# Altium footprint library CADTcommon.PcbLib: 503 footprints (part 26 of 32)
Each footprint in its own frame and in the unit in brackets; x right, y up, seen from the top. Pads: shape width x height; smd on the part's side, far side on the other; paste and mask are expansions set on the pad; w line width, h text height; cw(c..) or ccw(c..) is an arc to the next point about the centre after c.
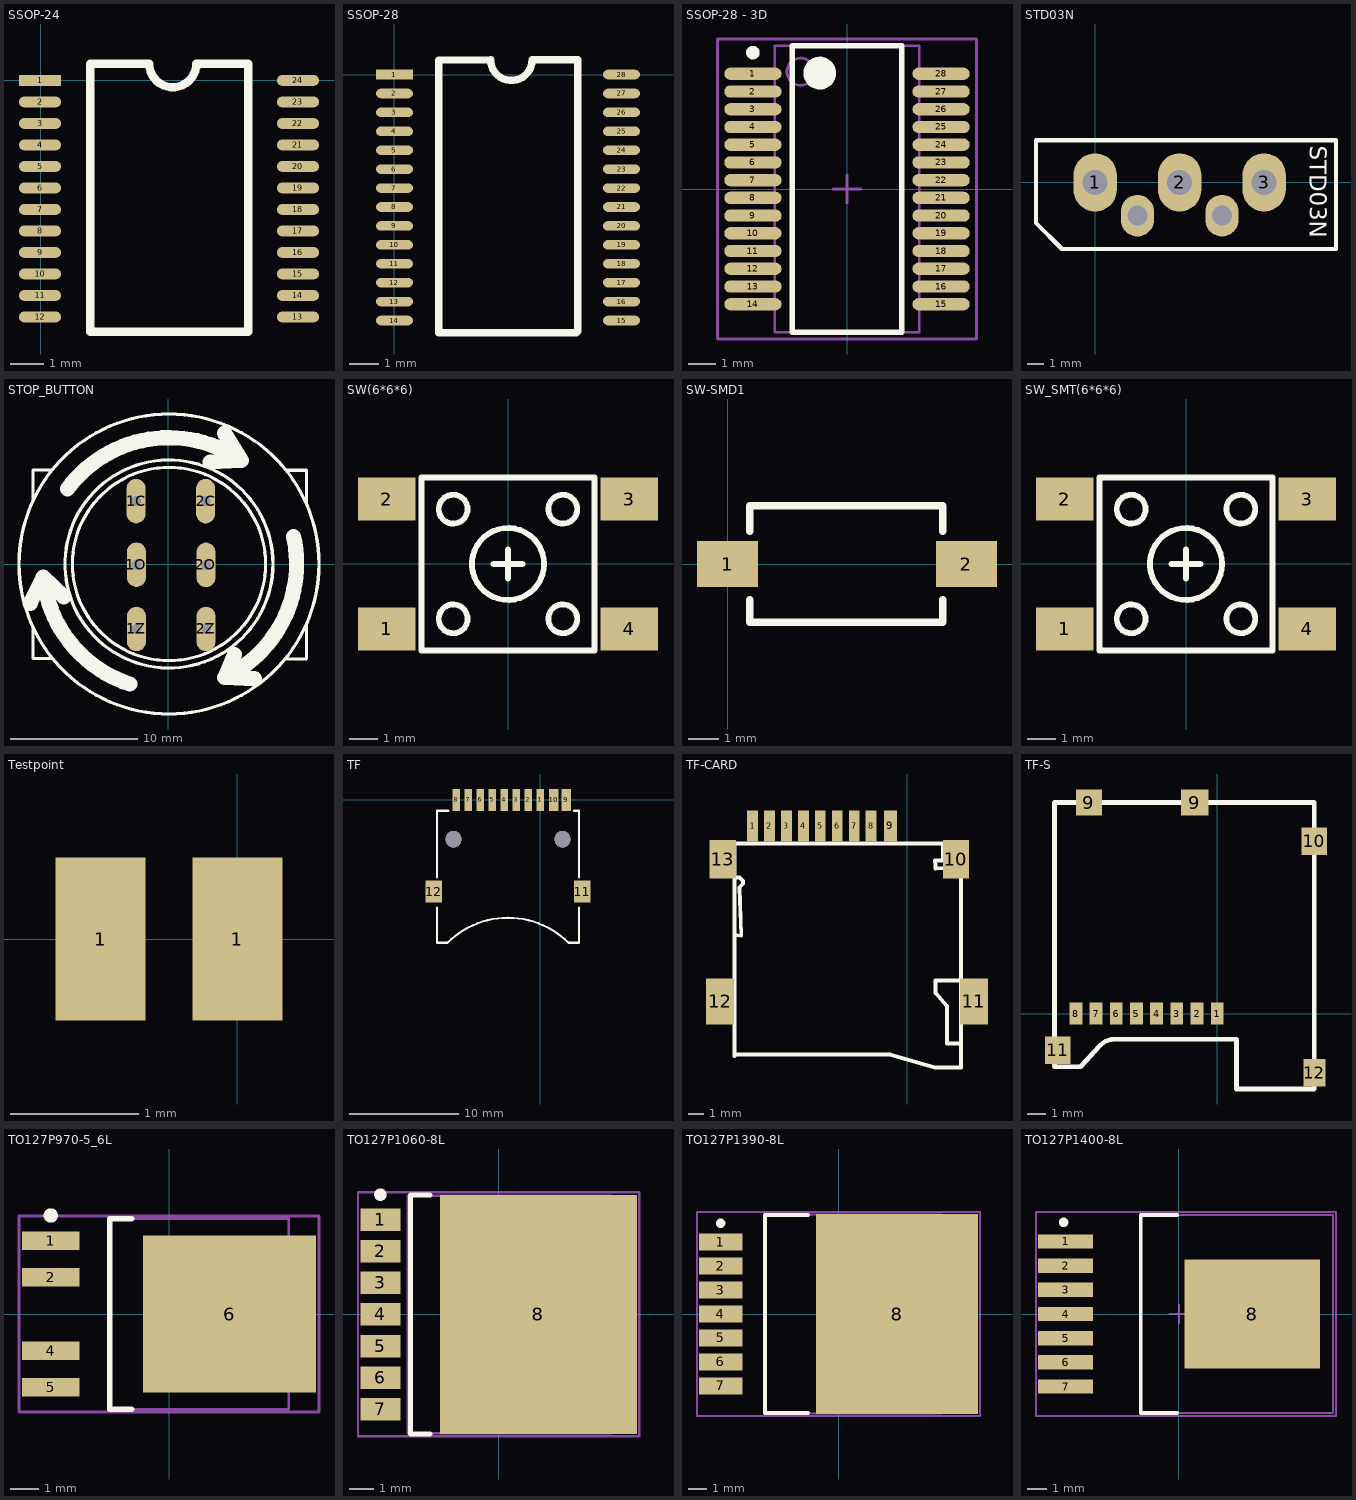
[diagram p25: the footprints below, top view; thin cyan lines are the x and y axes]

## SSOP-24 [mm]
pads (24):
  rect 1.27x0.33 smd: 1(-0.025,0)
  oval 1.27x0.33 smd: 2(-0.025,-0.65) 3(-0.025,-1.3) 4(-0.025,-1.95) 5(-0.025,-2.6) 6(-0.025,-3.25) 7(-0.025,-3.9) 8(-0.025,-4.55) 9(-0.025,-5.2) 10(-0.025,-5.85) 11(-0.025,-6.5) 12(-0.025,-7.15) 13(7.775,-7.15) 14(7.775,-6.5) 15(7.775,-5.85) 16(7.775,-5.2) 17(7.775,-4.55) 18(7.775,-3.9) 19(7.775,-3.25) 20(7.775,-2.6) 21(7.775,-1.95) 22(7.775,-1.3) 23(7.775,-0.65) 24(7.775,0)
Top Overlay:
  lines w0.254: 6.223,-7.6 1.499,-7.6 1.499,0.5 3.269,0.5 3.277,0.508 ccw(c3.99,0.508) 4.703,0.508 6.266,0.508 6.274,0.5 6.274,-7.6

## SSOP-28 [mm]
pads (28):
  rect 1.27x0.33 smd: 1(0,0)
  oval 1.27x0.33 smd: 2(0,-0.65) 3(0,-1.3) 4(0,-1.95) 5(0,-2.6) 6(0,-3.25) 7(0,-3.9) 8(0,-4.55) 9(0,-5.2) 10(0,-5.85) 11(0,-6.5) 12(0,-7.15) 13(0,-7.8) 14(0,-8.45) 15(7.8,-8.45) 16(7.8,-7.8) 17(7.8,-7.15) 18(7.8,-6.5) 19(7.8,-5.85) 20(7.8,-5.2) 21(7.8,-4.55) 22(7.8,-3.9) 23(7.8,-3.25) 24(7.8,-2.6) 25(7.8,-1.95) 26(7.8,-1.3) 27(7.8,-0.65) 28(7.8,0)
Top Overlay:
  lines w0.254: 1.524,-8.865 6.248,-8.865 6.299,-8.814 6.299,0.5 6.291,0.508 4.728,0.508 cw(c4.015,0.508) 3.302,0.508 3.294,0.5 1.524,0.5 1.524,-8.865

## SSOP-28 - 3D [mm] "SOP, 28-Leads, Body 10.5x5.3mm (max), Pitch 0.65mm, IPC Medium Density"
height 2
pads (28):
  oval 2.1x0.45 smd: 1(-3.45,4.225) 2(-3.45,3.575) 3(-3.45,2.925) 4(-3.45,2.275) 5(-3.45,1.625) 6(-3.45,0.975) 7(-3.45,0.325) 8(-3.45,-0.325) 9(-3.45,-0.975) 10(-3.45,-1.625) 11(-3.45,-2.275) 12(-3.45,-2.925) 13(-3.45,-3.575) 14(-3.45,-4.225) 15(3.45,-4.225) 16(3.45,-3.575) 17(3.45,-2.925) 18(3.45,-2.275) 19(3.45,-1.625) 20(3.45,-0.975) 21(3.45,-0.325) 22(3.45,0.325) 23(3.45,0.975) 24(3.45,1.625) 25(3.45,2.275) 26(3.45,2.925) 27(3.45,3.575) 28(3.45,4.225)
Top Overlay:
  circle w0.25: c-3.45,5 r0.125
  circle w0.6: c-1,4.25 r0.3
  lines w0.2: -2,-5.25 -2,5.25 2,5.25 2,-5.25 -2,-5.25
Mechanical 13:
  circle w0.1: c-1.7,4.3 r0.5
  lines w0.1: -2.65,-5.25 -2.65,5.25 2.65,5.25 2.65,-5.25 -2.65,-5.25
Mechanical 15:
  lines w0.1: -0.5,0 0.5,0 ; 0,-0.5 0,0.5 ; -4.75,-5.5 -4.75,5.5 4.75,5.5 4.75,-5.5 -4.75,-5.5
3D body: height 2, standoff 0.25, extent -2.65,-5.25 2.65,5.25

## STD03N [mm]
pads (5):
  oval 2.6x3.5 hole 1.5: 1(0,0) 2(5.08,0) 3(10.16,0)
  oval 2x2.5 hole 1.2: ""(2.54,-2) ""(7.62,-2)
Top Overlay:
  lines w0.254: -3.556,-2.438 -2.007,-3.988 ; -3.556,2.54 14.351,2.54 ; -3.55,-2.438 -3.55,2.534 14.478,2.534 14.478,-4 -2,-4
  text "STD03N" at 12.903,2.21 h1
Bottom Overlay:
  lines w0.254: -3.556,-2.438 -2.007,-3.988 ; -3.556,2.541 14.351,2.541 ; -3.55,-2.438 -3.55,2.535 ; -2,-4 14.478,-4 ; 14.478,2.535 14.478,2.541
3D body: height 30.15, standoff -9.1, extent -2.82,-2.261 12.93,2.889

## STOP_BUTTON [mm] "CE104"
pads (6):
  oval 1.5x3.5 hole 0.8: 1C(-2.547,4.948) 1O(-2.517,-0.052) 1Z(-2.517,-5.107) 2C(2.923,4.948) 2O(2.953,-0.067) 2Z(2.953,-5.107)
Top Overlay:
  circle w0.254: c0.043,0.003 r11.8
  circle w0.254: c0.043,0.003 r8.183
  circle w0.254: c0.043,0.003 r7.6
  lines w0.254: -10.647,-7.437 -10.647,-4.937 ; -10.647,4.973 -10.647,7.403 -9.157,7.403 ; -10.617,-7.437 -9.147,-7.437 ; 9.193,-7.467 10.853,-7.467 10.853,-4.707 ; 9.263,7.373 10.823,7.373 ; 10.853,4.713 10.853,7.373
  lines w1.2: -10.867,-3.077 -9.84,-1.021 ; -8.227,-2.577 -9.84,-1.021 ; -7.941,5.917 cw(c0.043,0.003) 5.734,8.147 ; -3.052,-9.439 cw(c0.043,0.003) -9.84,-1.021 ; 3.283,8.033 5.734,8.147 ; 4.403,10.293 5.734,8.147 ; 5.203,-7.107 4.438,-8.927 ; 6.753,-9.027 4.438,-8.927 ; 9.846,2.169 cw(c0.143,0.033) 4.438,-8.927
Mechanical 1:
  lines w1: -2.557,6.163 -2.547,3.753 ; -2.527,-3.892 -2.517,-6.302 ; -2.527,1.163 -2.517,-1.247 ; 2.913,3.673 2.913,6.173 ; 2.943,-3.892 2.953,-6.302 ; 2.943,1.148 2.953,-1.262

## SW(6*6*6) [mm]
pads (4):
  rect 2x1.5 smd: 1(-4.204,-2.266) 2(-4.204,2.234) 3(4.196,2.234) 4(4.196,-2.266)
Top Overlay:
  circle w0.2: c-1.904,-1.916 r0.5
  circle w0.2: c-1.904,1.884 r0.5
  circle w0.2: c1.896,-1.916 r0.5
  circle w0.2: c1.896,1.884 r0.5
  circle w0.2: c-0.004,-0.016 r1.25
  lines w0.2: -0.504,-0.016 0.496,-0.016 ; -0.004,-0.516 -0.004,0.484 ; -3.004,-3.016 2.996,-3.016 2.996,2.984 -3.004,2.984 -3.004,-3.016

## SW-SMD1 [mm]
pads (2):
  rect 2x1.5 smd: 1(0,0) 2(7.8,0)
Top Overlay:
  lines w0.254: 0.725,-1.168 0.725,-1.9 7.025,-1.9 7.025,-1.168 ; 0.725,1.067 0.725,1.9 7.025,1.9 7.025,1.067
3D body: height 2.5, standoff 0, extent -0.059,-1.945 7.831,1.905

## SW_SMT(6*6*6) [mm]
pads (4):
  rect 2x1.5 smd: 1(-4.204,-2.266) 2(-4.204,2.234) 3(4.196,2.234) 4(4.196,-2.266)
Top Overlay:
  circle w0.2: c-0.004,-0.016 r1.25
  circle w0.2: c1.896,1.884 r0.5
  circle w0.2: c1.896,-1.916 r0.5
  circle w0.2: c-1.904,1.884 r0.5
  circle w0.2: c-1.904,-1.916 r0.5
  lines w0.2: -0.504,-0.016 0.496,-0.016 ; -0.004,-0.516 -0.004,0.484 ; -3.004,-3.016 -3.004,2.984 2.996,2.984 2.996,-3.016 -3.004,-3.016

## Testpoint [mm]
pads (2):
  rect 0.7x1.27 smd: 1(-1.067,0) 1(0,0)

## TF [mm]
pads (12):
  rect 0.7x2 smd: 1(0,0) 2(-1.1,0) 3(-2.2,0) 4(-3.3,0) 5(-4.4,0) 6(-5.5,0) 7(-6.6,0) 8(-7.7,0)
  rect 0.85x2 smd: 9(2.4,0) 10(1.25,0)
  rect 1.5x2 smd: 11(3.87,-8.4) 12(-9.77,-8.4)
via 2.05,-3.6 diameter 1.5 hole 1.5
via -7.95,-3.6 diameter 1.5 hole 1.5
Top Overlay:
  lines w0.2: -9.465,-9.872 -9.465,-13.1 -8.5,-13.1 cw(c-2.95,-18.65) 2.6,-13.1 3.565,-13.1 3.565,-9.872 ; -9.465,-7.103 -9.465,-1 -8.417,-1 ; 3.108,-1 3.565,-1 3.565,-7.103

## TF-CARD [mm]
pads (13):
  rect 0.7x2 smd: 1(-10.058,-7.188) 2(-8.958,-7.188) 3(-7.858,-7.188) 4(-6.758,-7.188) 5(-5.658,-7.188) 6(-4.558,-7.188) 7(-3.458,-7.188) 8(-2.358,-7.188)
  rect 0.85x2 smd: 9(-1.108,-7.188)
  rect 1.7x2.5 smd: 10(3.15,-9.373) 13(-11.989,-9.373)
  rect 1.8x3 smd: 11(4.318,-18.593) 12(-12.167,-18.593)
Top Overlay:
  lines w0.254: -11.227,-22.149 -11.227,-8.331 2.311,-8.331 2.311,-9.449 1.803,-9.449 1.829,-9.754 1.829,-9.964 3.48,-9.938 3.48,-22.885 1.778,-22.885 -1.143,-22.047 -11.227,-22.047 ; -11.227,-14.275 -10.795,-14.326 -10.897,-11.176 -10.668,-10.947 -10.668,-10.77 -10.897,-10.541 -11.176,-10.541 ; 3.429,-21.336 2.565,-21.336 2.565,-18.898 1.829,-18.034 1.829,-17.221 3.48,-17.221

## TF-S [mm]
pads (13):
  rect 0.7x1.2 smd: 1(0,0) 2(-1.1,0) 3(-2.2,0) 4(-3.3,0) 5(-4.4,0) 6(-5.5,0) 7(-6.6,0) 8(-7.7,0)
  rect 1.4x1.4 smd: 9(-6.99,11.5)
  rect 1.48x1.4 smd: 9(-1.22,11.5)
  rect 1.4x1.5 smd: 10(5.3,9.379) 11(-8.7,-2)
  rect 1.2x1.5 smd: 12(5.3,-3.23)
Top Overlay:
  lines w0.254: -8.868,-2.9 -8.106,-2.9 -7.452,-2.9 -6.38,-1.728 ; -8.868,-2.8 -8.868,11.5 5.3,11.5 5.3,-4.115 1.051,-4.115 1.051,-1.406 -5.582,-1.406 ; -6.4,-1.748 -6.38,-1.728 ; -5.588,-1.4 ccw(c-5.588,-2.52) -6.38,-1.728

## TO127P970-5_6L [mm] "D-PAK, 6-Leads, Body 6.1x6.5mm, Pitch 1.27mm, Lead Span 9.7mm, IPC High Density"
height 2.4
pads (5):
  rect 2x0.65 smd: 1(-4.1,2.54) 2(-4.1,1.27) 4(-4.1,-1.27) 5(-4.1,-2.54)
  rect 6x5.45 smd: 6(2.1,0)
Top Overlay:
  circle w0.25: c-4.1,3.415 r0.125
  lines w0.2: -1.3,-3.3 -2.05,-3.3 -2.05,3.3 -1.3,3.3
Mechanical 13:
  lines w0.1: -2.05,-3.3 4.15,-3.3 4.15,3.3 -2.05,3.3 -2.05,-3.3
Mechanical 15:
  lines w0.1: -0.5,0 0.5,0 ; 0,-0.5 0,0.5 ; -5.2,-3.4 5.2,-3.4 5.2,3.4 -5.2,3.4 -5.2,-3.4
3D body: height 2.4, standoff 0, extent -2.05,-3.3 4.15,3.3

## TO127P1060-8L [mm] "D-PAK, 8-Leads, Body 8x9.4mm, Pitch 1.27mm, Lead Span 10.6mm, IPC High Density"
height 2.05
pads (8):
  rect 1.6x0.9 smd: 1(-4.75,3.81) 2(-4.75,2.54) 3(-4.75,1.27) 4(-4.75,0) 5(-4.75,-1.27) 6(-4.75,-2.54) 7(-4.75,-3.81)
  rect 7.9x9.6 smd: 8(1.6,0)
Top Overlay:
  circle w0.25: c-4.75,4.81 r0.125
  lines w0.2: -2.75,-4.8 -3.55,-4.8 -3.55,4.8 -2.75,4.8
Mechanical 13:
  lines w0.1: -3.65,-4.775 4.5,-4.775 4.5,4.775 -3.65,4.775 -3.65,-4.775
Mechanical 15:
  lines w0.1: -0.5,0 0.5,0 ; 0,-0.5 0,0.5 ; -5.65,-4.9 5.65,-4.9 5.65,4.9 -5.65,4.9 -5.65,-4.9
3D body: height 2.05, standoff 0, extent -3.65,-4.775 4.5,4.775

## TO127P1390-8L [mm] "D2-PAK, 8-Leads, Body 8.9x10.2mm, Pitch 1.27mm, Lead Span 13.9mm, IPC High Density"
height 4.57
pads (8):
  rect 2.3x0.9 smd: 1(-6.25,3.81) 2(-6.25,2.54) 3(-6.25,1.27) 4(-6.25,0) 5(-6.25,-1.27) 6(-6.25,-2.54) 7(-6.25,-3.81)
  rect 8.6x10.6 smd: 8(3.1,0)
Top Overlay:
  circle w0.25: c-6.25,4.81 r0.125
  lines w0.2: -1.6,-5.25 -3.9,-5.25 -3.9,5.25 -1.6,5.25
Mechanical 13:
  lines w0.1: -3.9,-5.275 -3.9,5.275 5.5,5.275 5.5,-5.275 -3.9,-5.275
Mechanical 15:
  lines w0.1: -0.5,0 0.5,0 ; 0,-0.5 0,0.5 ; -7.5,-5.4 -7.5,5.4 7.5,5.4 7.5,-5.4 -7.5,-5.4
3D body: height 4.57, standoff 0, extent -3.9,-5.275 5.5,5.275

## TO127P1400-8L [mm] "D2-PAK, 8-Leads, Body 9.9x10.2mm, Pitch 1.27mm, Lead Span 14mm, IPC High Density"
height 2.1
pads (8):
  rect 2.9x0.75 smd: 1(-5.95,3.81) 2(-5.95,2.54) 3(-5.95,1.27) 4(-5.95,0) 5(-5.95,-1.27) 6(-5.95,-2.54) 7(-5.95,-3.81)
  rect 7.1x5.7 smd: 8(3.85,0)
Top Overlay:
  circle w0.25: c-6.05,4.815 r0.125
  lines w0.2: -0.1,-5.2 -2,-5.2 -2,5.2 -0.1,5.2
Mechanical 13:
  lines w0.1: -2,-5.2 -2,5.2 8.1,5.2 8.1,-5.2 -2,-5.2
Mechanical 15:
  lines w0.1: -0.5,0 0.5,0 ; 0,-0.5 0,0.5 ; -7.5,-5.35 -7.5,5.35 8.25,5.35 8.25,-5.35 -7.5,-5.35
3D body: height 2.1, standoff 0, extent -1.999,-5.199 8.099,5.199